# Altium footprint library PCBLIB.PcbLib: 557 footprints (part 35 of 36)
Each footprint in its own frame and in the unit in brackets; x right, y up, seen from the top. Pads: shape width x height; smd on the part's side, far side on the other; paste and mask are expansions set on the pad; w line width, h text height; cw(c..) or ccw(c..) is an arc to the next point about the centre after c.
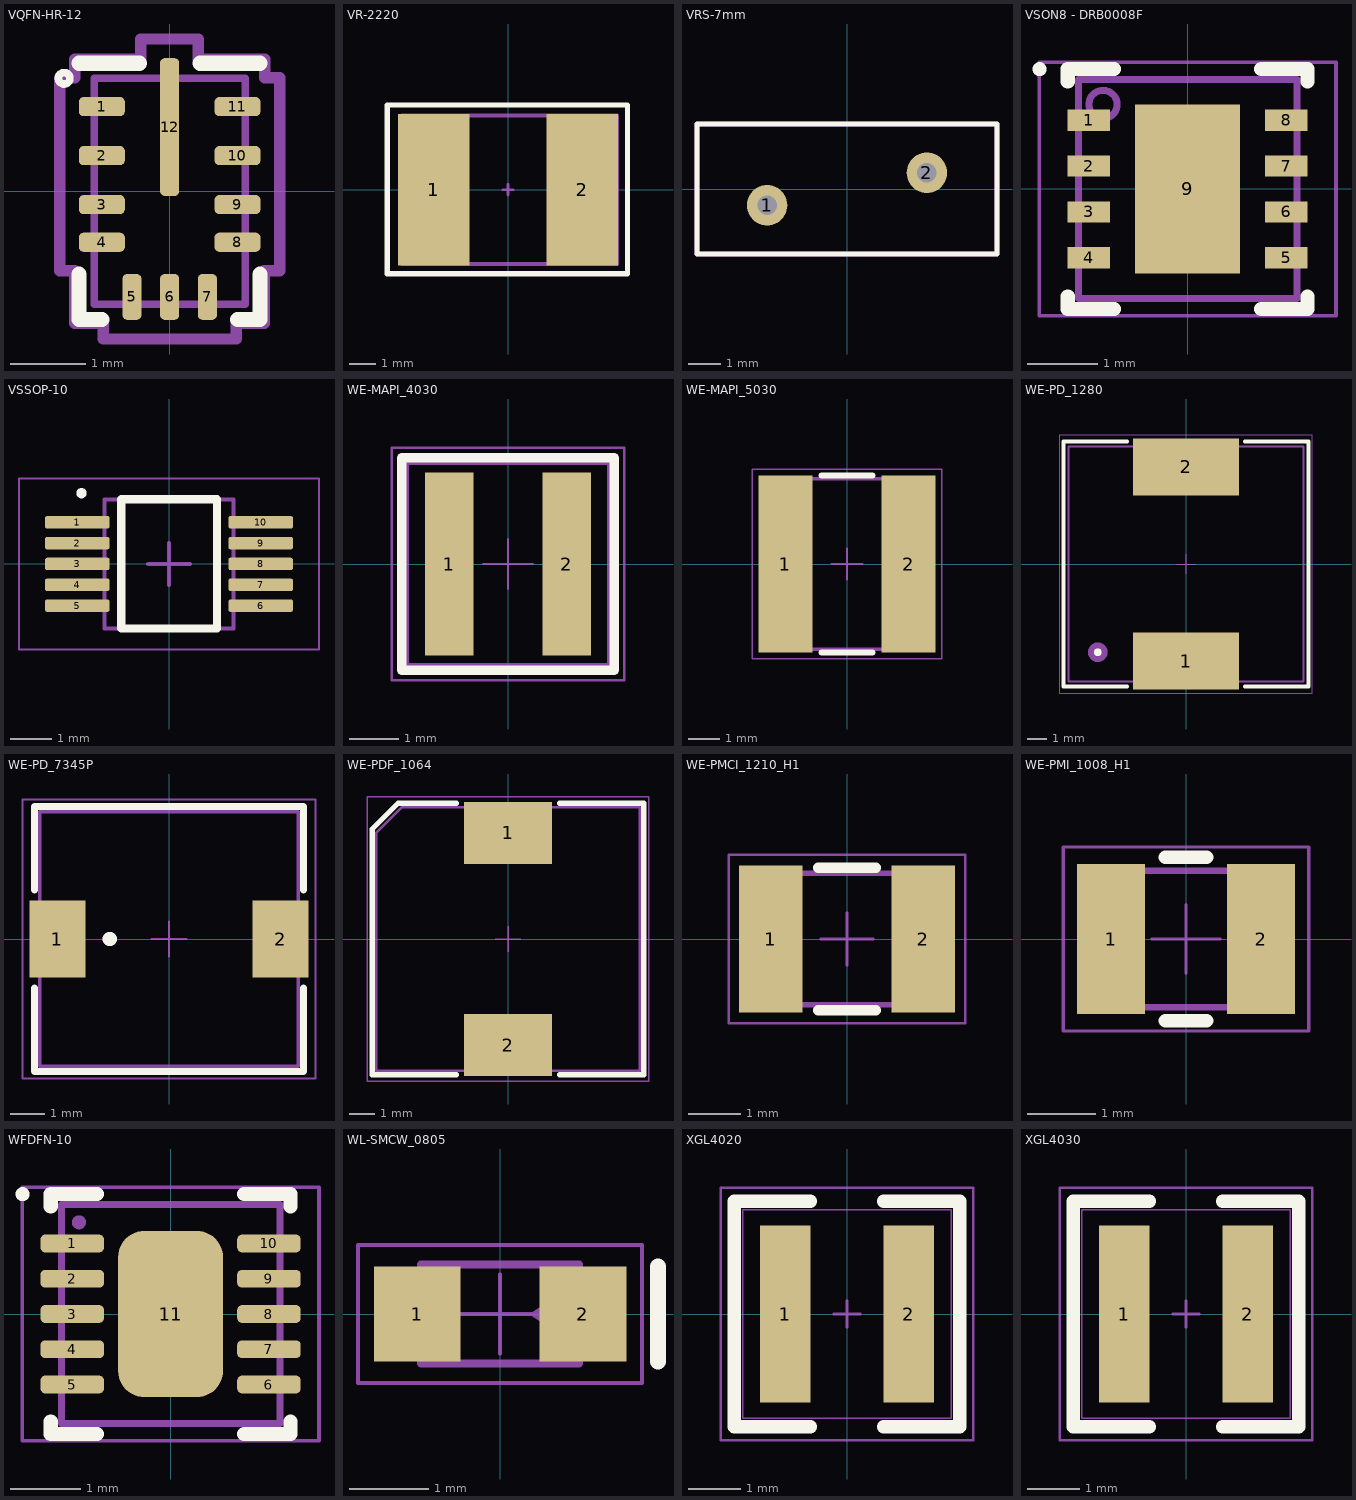
[diagram p34: the footprints below, top view; thin cyan lines are the x and y axes]

## VQFN-HR-12 [mil] "RNX0012B"
height 35.43
pads (12):
  rrect50% 24x10 smd paste+0 mask+2: 1(-35.43,44.29) 2(-35.43,18.7) 3(-35.43,-6.89) 4(-35.43,-26.57) 8(35.43,-26.57) 9(35.43,-6.89) 10(35.43,18.7) 11(35.43,44.29)
  rrect50% 10x24 smd paste+0 mask+2: 5(-19.68,-55.12) 6(0,-55.12) 7(19.68,-55.12)
  rrect50% 10x72 smd paste+0 mask+3: 12(0,33.58)
Top Overlay:
  circle w3.94: c-55.12,59.06 r3
  lines w7.87: -47.24,-43.31 -47.24,-66.93 -35.43,-66.93 ; -47.24,66.93 -15.75,66.93 ; 15.75,66.93 47.24,66.93 ; 35.43,-66.93 47.24,-66.93 47.24,-43.31
Mechanical 15:
  lines w6: -57.43,-41.57 -57.43,59.29 -49.5,59.29 -49.5,69 -15,69 -15,79.58 15,79.58 15,69 49.56,69 49.55,59.29 57.43,59.29 57.43,-41.57 49.51,-41.57 49.5,-69 34.69,-69 34.69,-77.12 -34.69,-77.12 -34.69,-69 -49.5,-69 -49.5,-41.57 -57.43,-41.57
ASM Top:
  circle w3.94: c-28.38,45.09 r1.96
  lines w3.94: -39.5,-59 -39.5,59 39.5,59 39.5,-59 -39.5,-59
  text ".designator" at -11.81,-7.87 h31.5
3D body "User Library-vqfn_hr_12.step": height 31.89, standoff 0, extent -40.16,-59.84 40.15,59.84

## VR-2220 [mm] "2220, 2-Leads, Body 9.4x5.7mm, Pitch 6.7mm"
height 2.5
pads (2):
  rect 2.7x5.7 smd: 1(-2.8,0) 2(2.8,0)
Top Overlay:
  lines w0.2: -4.55,-3.17 4.5,-3.17 4.5,3.19 -4.55,3.19 -4.55,-3.17
Mechanical 15:
  lines w0.1: -0.2,0 0.2,0 ; 0,-0.2 0,0.2 ; -4.55,-3.17 -4.55,3.22 4.51,3.22 4.51,-3.17 -4.55,-3.17
ASM Top:
  lines w0.15: -4,-2.8 4.1,-2.8 4.1,2.8 -4,2.8 -4,-2.8
  text ".designator" at -0.8,-0.3 h1.5
3D body "WE-VS_2220_VS.stp": height 2.45, standoff -0.05, extent -2.85,-2.48 2.85,2.52

## VRS-7mm [mil]
pads (2):
  round 50 hole 24: 1(-98.5,-20) 2(98.5,20)
Top Overlay:
  lines w6: -185,-80 185,-80 185,80 -185,80 -185,-80
ASM Top:
  lines w6: -185,-80 -185,80 185,80 185,-80 -185,-80
  text ".designator" at -171,10 h31.5
3D body "varistor 7mm.stp": height 437.17, standoff -783.31, extent -176.83,-68.9 177.5,68.9

## VSON8 - DRB0008F [mm] "DRB0008F  THVD1450"
height 1
pads (9):
  rect 0.6x0.3 smd: 1(-1.4,0.975) 2(-1.4,0.325) 3(-1.4,-0.325) 4(-1.4,-0.975) 5(1.4,-0.975) 6(1.4,-0.325) 7(1.4,0.325) 8(1.4,0.975)
  rect 1.49x2.4 smd: 9(0,0)
Top Overlay:
  circle w0.1: c-2.1,1.7 r0.05
  lines w0.2: -1.7,-1.525 -1.7,-1.7 -1.045,-1.7 ; -1.7,1.525 -1.7,1.7 -1.045,1.7 ; 1.045,-1.7 1.7,-1.7 1.7,-1.525 ; 1.045,1.7 1.7,1.7 1.7,1.525
Mechanical 15:
  lines w0.05: -2.105,-1.8 -2.105,1.8 2.105,1.8 2.105,-1.8 -2.105,-1.8
  lines w0.1: -0.5,0 0.5,0 ; 0,-0.5 0,0.5
ASM Top:
  circle w0.1: c-1.2,1.2 r0.2
  lines w0.1: -1.55,-1.55 1.55,-1.55 1.55,1.55 -1.55,1.55 -1.55,-1.55
  text ".designator" at 0.5,-1.2 h0.8
3D body "VSON8 - DRB0008F.step": height 1, standoff 0, extent -1.6,-1.55 1.6,1.55

## VSSOP-10 [mm] "TSSOP, 10-Leads, Body 3x3mm, Pitch 0.5mm, IPC Low Density"
height 1.09
pads (10):
  rrect33% 1.55x0.3 smd mask+0.05: 1(-2.2,1) 2(-2.2,0.5) 3(-2.2,0) 4(-2.2,-0.5) 5(-2.2,-1) 6(2.2,-1) 7(2.2,-0.5) 8(2.2,0) 9(2.2,0.5) 10(2.2,1)
Top Overlay:
  circle w0.25: c-2.1,1.7 r0
  lines w0.2: -1.15,-1.55 1.15,-1.55 1.15,1.55 -1.15,1.55 -1.15,-1.55
Mechanical 15:
  lines w0.05: -3.6,-2.051 3.6,-2.051 3.6,2.049 -3.6,2.049 -3.6,-2.051
  lines w0.1: -0.5,-0.001 0.5,-0.001 ; 0,-0.501 0,0.499
ASM Top:
  lines w0.1: -1.55,-1.55 -1.55,1.55 1.55,1.55 1.55,-1.55 -1.55,-1.55
3D body: height 1.09, standoff 0.06, extent -1.55,-1.55 1.55,1.55
3D body "DGS0010AakaMUB10A.stp": height 0.94, standoff -0.02, extent -2.451,-1.5 2.451,1.497

## WE-MAPI_4030 [mm] "SMT Shielded Power Inductor, body 4.1x4.1mm"
height 3.1
pads (2):
  rect 0.98x3.7 smd: 1(-1.185,0) 2(1.185,0)
Top Overlay:
  lines w0.2: -2.15,-2.15 -2.15,2.15 2.15,2.15 2.15,-2.15 -2.15,-2.15
Mechanical 15:
  lines w0.05: -0.5,0 0.5,0 ; 0,-0.5 0,0.5 ; -2.35,-2.35 2.35,-2.35 2.35,2.35 -2.35,2.35 -2.35,-2.35
ASM Top:
  lines w0.1: -2.05,-2.05 2.05,-2.05 2.05,2.05 -2.05,2.05 -2.05,-2.05
  text ".designator" at -0.4,-0.061 h0.8
3D body "74438357022_Download_WE-MAPI-4030_stp_rev1.stp": height 3.1, standoff 0, extent -2.05,-2.05 2.05,2.05

## WE-MAPI_5030 [mm] "SMD Power Inductor, 2-leads, body 5.6x5.6mm"
height 3.1
pads (2):
  rect 1.7x5.6 smd: 1(-1.95,0) 2(1.95,0)
Top Overlay:
  lines w0.2: -0.8,-2.8 0.8,-2.8 ; -0.8,2.8 0.8,2.8
Mechanical 15:
  lines w0.05: -0.5,0 0.5,0 ; 0,-0.5 0,0.5 ; -3,-3 -3,3 3,3 3,-3 -3,-3
ASM Top:
  lines w0.1: -2.7,-2.7 -2.7,2.7 2.7,2.7 2.7,-2.7 -2.7,-2.7
  text ".designator" at 0,0 h0.8
3D body "74438367xxx_5030.stp": height 3.1, standoff 0, extent -2.7,-2.7 2.7,2.7

## WE-PD_1280 [mm] "SMT Shielded Power Inductor, 2-leads, body 12x12mm"
height 8
pads (2):
  rect 5.4x2.9 smd: 1(0,-4.95) 2(0,4.95)
Top Overlay:
  circle w0.3: c-4.5,-4.5 r0.05
  lines w0.2: -3,-6.25 -6.25,-6.25 -6.25,6.25 -3,6.25 ; 3,-6.25 6.25,-6.25 6.25,6.25 3,6.25
Mechanical 15:
  lines w0.05: -0.5,0 0.5,0 ; 0,-0.5 0,0.5 ; -6.45,-6.6 6.45,-6.6 6.45,6.6 -6.45,6.6 -6.45,-6.6
ASM Top:
  circle w0.5: c-4.5,-4.5 r0.25
  lines w0.1: -6,-6 -6,6 6,6 6,-6 -6,-6
  text ".designator" at -0.5,-0.161 h0.8
3D body "WE-PD_1280_m-base_744770xxx.stp": height 7.51, standoff 0.05, extent -6,-6 6,6

## WE-PD_7345P [mm] "SMT Shielded Power Inductor, 2-leads, body 7.3x7.4mm"
height 4.5
pads (2):
  rect 1.6x2.2 smd: 1(-3.2,0) 2(3.2,0)
Top Overlay:
  circle w0.4: c-1.7,0 r0.005
  lines w0.2: -3.85,-1.4 -3.85,-3.8 3.85,-3.8 3.85,-1.4 ; -3.85,1.4 -3.85,3.8 3.85,3.8 3.85,1.4
Mechanical 15:
  lines w0.05: -0.5,0 0.5,0 ; 0,-0.5 0,0.5 ; -4.2,-4 -4.2,4 4.2,4 4.2,-4 -4.2,-4
ASM Top:
  circle w0.4: c-1.7,0 r0.005
  lines w0.1: -3.7,-3.65 -3.7,3.65 3.7,3.65 3.7,-3.65 -3.7,-3.65
  text ".designator" at 0,0 h0.8
3D body "WE-PD_7345_clip_7447773xxx.stp": height 4.22, standoff 0, extent -3.65,-3.651 3.65,3.651

## WE-PDF_1064 [mm] "SMD Shielded Power Inductor, body 10.2x10.2mm"
height 6.4
pads (2):
  rect 3.4x2.4 smd: 1(0,4.1) 2(0,-4.1)
Top Overlay:
  lines w0.2: -2,-5.25 -5.25,-5.25 -5.25,4.25 -4.25,5.25 -2,5.25 ; 2,-5.25 5.25,-5.25 5.25,5.25 2,5.25
Mechanical 15:
  lines w0.05: -0.5,0 0.5,0 ; 0,-0.5 0,0.5 ; -5.45,-5.5 5.45,-5.5 5.45,5.5 -5.45,5.5 -5.45,-5.5
ASM Top:
  lines w0.1: -5.1,-5.1 -5.1,4.1 -4.1,5.1 5.1,5.1 5.1,-5.1 -5.1,-5.1
  text ".designator" at -0.5,-0.2 h1.5
3D body "7447798xxx.stp": height 6.4, standoff 0, extent -5.1,-5.1 5.1,5.1

## WE-PMCI_1210_H1 [mm] "Power Molded Chip Inductor, body 3.2x2.5mm"
height 1
pads (2):
  rect 1.2x2.8 smd: 1(-1.45,0) 2(1.45,0)
Top Overlay:
  lines w0.2: -0.55,-1.35 0.55,-1.35 ; -0.55,1.35 0.55,1.35
Mechanical 15:
  lines w0.05: -0.5,0 0.5,0 ; 0,-0.5 0,0.5 ; -2.25,-1.6 -2.25,1.6 2.25,1.6 2.25,-1.6 -2.25,-1.6
ASM Top:
  lines w0.1: -1.6,-1.25 -1.6,1.25 1.6,1.25 1.6,-1.25 -1.6,-1.25
  text ".designator" at -0.4,-0.2 h0.8
3D body "74479298xxx_1210.stp": height 1, standoff 0, extent -1.6,-1.25 1.6,1.25

## WE-PMI_1008_H1 [mm] "Power Multilayer Inductor, body 2.5x2mm"
height 1
pads (2):
  rect 1x2.2 smd: 1(-1.1,0) 2(1.1,0)
Top Overlay:
  lines w0.2: -0.3,-1.2 0.3,-1.2 ; -0.3,1.2 0.3,1.2
Mechanical 15:
  lines w0.05: -0.5,0 0.5,0 ; 0,-0.5 0,0.5 ; -1.8,-1.35 1.8,-1.35 1.8,1.35 -1.8,1.35 -1.8,-1.35
ASM Top:
  lines w0.1: -1.25,-1 1.25,-1 1.25,1 -1.25,1 -1.25,-1
  text ".designator" at -0.4,-0.161 h0.8
3D body "74479787xxxA_1008.stp": height 1, standoff 0, extent -1.25,-1 1.25,1

## WFDFN-10 [mm] "SON, 10-Leads, Body 3,00x3,00mm, Pitch 0,50mm, Thermal Pad 2,36x1,49mm, IPC Medium Density"
height 0.8
pads (11):
  rrect50% 0.9x0.25 smd mask+0.05: 1(-1.395,1) 2(-1.395,0.5) 3(-1.395,0) 4(-1.395,-0.5) 5(-1.395,-1) 6(1.395,-1) 7(1.395,-0.5) 8(1.395,0) 9(1.395,0.5) 10(1.395,1)
  rrect50% 1.49x2.36 smd mask+0.05: 11(0,0)
Top Overlay:
  circle w0.1: c-2.1,1.7 r0.05
  lines w0.2: -1.7,-1.525 -1.7,-1.7 -1.045,-1.7 ; -1.7,1.525 -1.7,1.7 -1.045,1.7 ; 1.045,-1.7 1.7,-1.7 1.7,-1.525 ; 1.045,1.7 1.7,1.7 1.7,1.525
Mechanical 15:
  lines w0.05: -2.105,-1.8 2.105,-1.8 2.105,1.8 -2.105,1.8 -2.105,-1.8
  lines w0.1: -0.5,0 0.5,0 ; 0,-0.5 0,0.5
ASM Top:
  circle w0.1: c-1.3,1.3 r0.05
  lines w0.1: -1.55,-1.55 -1.55,1.55 1.55,1.55 1.55,-1.55 -1.55,-1.55
  text ".designator" at 0,0 h0.8
3D body "User Library-LFCSP_WD-10.step": height 0.81, standoff 0.01, extent -1.55,-1.5 1.55,1.5

## WL-SMCW_0805 [mm] "SMD Mono-color Chip LED, body 2.0x1.25mm"
height 0.7
pads (2):
  rect 1.1x1.2 smd: 1(-1.05,0) 2(1.05,0)
Top Overlay:
  lines w0.2: 2,-0.6 2,0.6
Mechanical 15:
  lines w0.05: -0.5,0 0.5,0 ; 0,-0.5 0,0.5 ; -1.8,-0.875 1.8,-0.875 1.8,0.875 -1.8,0.875 -1.8,-0.875
ASM Top:
  region: 0.367,0 0.9,-0.35 0.9,0.35
  lines w0.1: -1,-0.625 -1,0.625 1,0.625 1,-0.625 -1,-0.625
  text ".designator" at -0.855,-0.386 h0.8
3D body "150080xS75000.stp": height 0.7, standoff 0, extent -1,-0.625 1,0.625

## XGL4020 [mil] "Coilcraft High Temperature Shielded Power Inductors"
height 122
pads (2):
  rect 38x133 smd: 1(-46.5,0) 2(46.5,0)
Top Overlay:
  lines w10: -27.5,-85 -85,-85 -85,85 -27.5,85 ; 27.5,-85 85,-85 85,85 27.5,85
Mechanical 14:
  lines w1: -78.5,-78.5 -78.5,78.5 78.5,78.5 78.5,-78.5 -78.5,-78.5
Mechanical 15:
  lines w2: -10,0 10,0 ; 0,-10 0,10 ; -95,-95 95,-95 95,95 -95,95 -95,-95
3D body "Coilcraft-XGL4020.step": height 82.74, standoff 0.06, extent -84.65,-84.65 84.65,84.65

## XGL4030 [mil] "Coilcraft High Temperature Shielded Power Inductors"
height 122
pads (2):
  rect 38x133 smd: 1(-46.5,0) 2(46.5,0)
Top Overlay:
  lines w10: -27.5,-85 -85,-85 -85,85 -27.5,85 ; 27.5,-85 85,-85 85,85 27.5,85
Mechanical 14:
  lines w1: -78.5,-78.5 -78.5,78.5 78.5,78.5 78.5,-78.5 -78.5,-78.5
Mechanical 15:
  lines w2: -10,0 10,0 ; 0,-10 0,10 ; -95,-95 95,-95 95,95 -95,95 -95,-95
3D body "XAL4030.STEP": height 122.11, standoff 0.06, extent -84.65,-84.65 84.65,84.65